# Altium footprint library ICL_komponenty_v1.PcbLib: 160 footprints (part 2 of 10)
Each footprint in its own frame and in the unit in brackets; x right, y up, seen from the top. Pads: shape width x height; smd on the part's side, far side on the other; paste and mask are expansions set on the pad; w line width, h text height; cw(c..) or ccw(c..) is an arc to the next point about the centre after c.
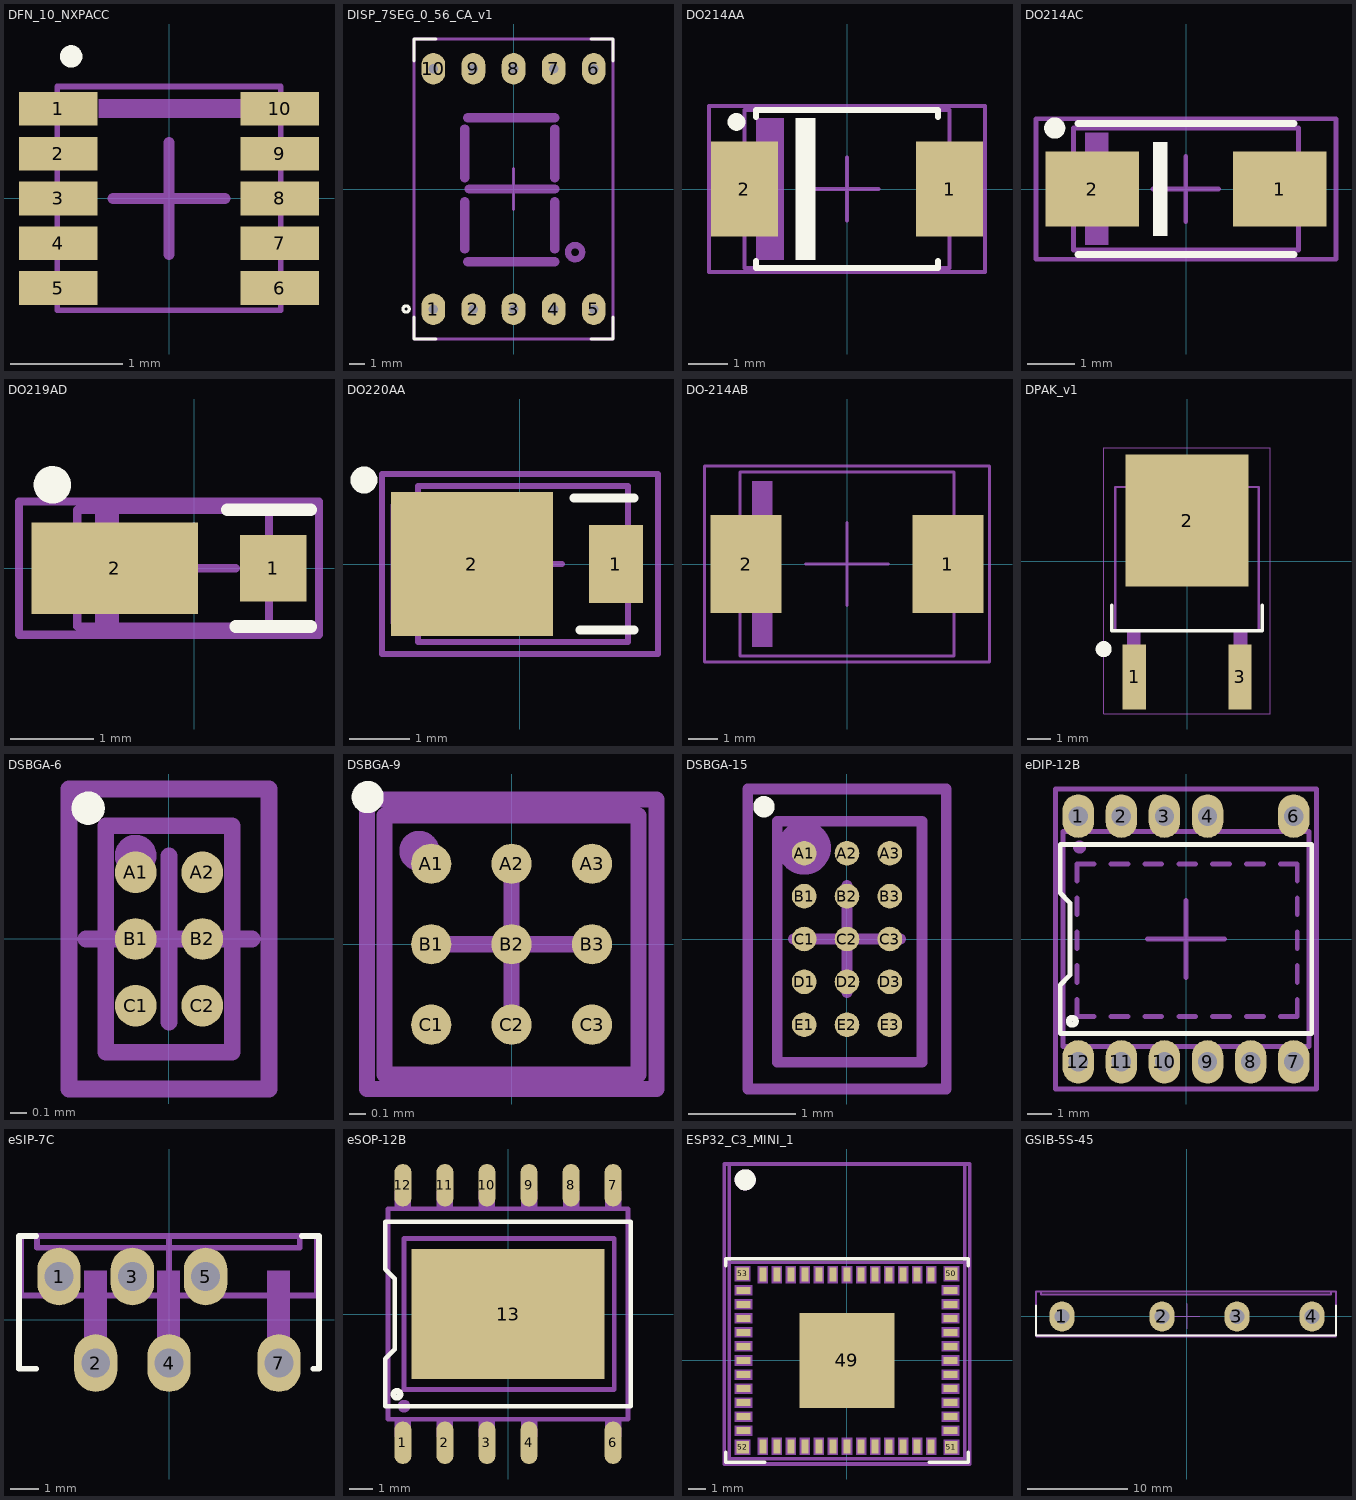
[diagram p1: the footprints below, top view; thin cyan lines are the x and y axes]

## DFN_10_NXPACC [mm] "FXLS8964"
height 1
pads (10):
  rect 0.7x0.3 smd: 1(-0.99,0.8) 2(-0.99,0.4) 3(-0.99,0) 4(-0.99,-0.4) 5(-0.99,-0.8) 6(0.99,-0.8) 7(0.99,-0.4) 8(0.99,0) 9(0.99,0.4) 10(0.99,0.8)
Top Overlay:
  circle w0.1: c-0.874,1.269 r0.05
Top M11-12_SMOT:
  rectangle: -0.628,0.719 0.653,0.887
  region: 1.041,0.131 0.831,0.131 0.831,-0.122 1.041,-0.122
  rectangle: -1.041,-0.131 -0.831,0.122
  region: 1.041,0.931 0.831,0.931 0.831,0.678 1.041,0.678
  region: 1.041,0.531 0.831,0.531 0.831,0.278 1.041,0.278
  region: 1.041,-0.269 0.831,-0.269 0.831,-0.522 1.041,-0.522
  region: 1.041,-0.669 0.831,-0.669 0.831,-0.922 1.041,-0.922
  rectangle: -1.041,0.269 -0.831,0.522
  rectangle: -1.041,0.669 -0.831,0.922
  rectangle: -1.041,-0.931 -0.831,-0.678
  rectangle: -1.041,-0.531 -0.831,-0.278
  lines w0.05: -1,-0.999 1,-0.999 1,1 -1,1 -1,-0.999
Top M13-14_SDES:
  text "'.Designator'" at 0.25,-3.399 h0.6
Top M15-16_SORG:
  lines w0.1: -0.5,0 0.5,0 ; 0,-0.5 0,0.5
3D body "DFN_10_NXPACC.step": height 1, standoff 0, extent -1.001,-1 1.001,1

## DISP_7SEG_0_56_CA_v1 [mm]
pads (10):
  oval 1.5x2 hole 0.6: 1(-5.08,-7.62) 2(-2.54,-7.62) 3(0,-7.62) 4(2.54,-7.62) 5(5.08,-7.62) 6(5.08,7.62) 7(2.54,7.62) 8(0,7.62) 9(-2.54,7.62) 10(-5.08,7.62)
Top Overlay:
  circle w0.2: c-6.8,-7.6 r0.2
  lines w0.2: -6.3,-8.1 -6.3,-9.5 -4.9,-9.5 ; -6.3,8.1 -6.3,9.5 -4.9,9.5 ; 4.9,-9.5 6.3,-9.5 6.3,-8.1 ; 4.9,9.5 6.3,9.5 6.3,8.1
Top M17-18_TDES:
  text "'.Designator'" at -4.865,3.283 h1
Top M19-20_TMOT:
  circle w0.4: c3.9,-4 r0.447
  lines w0.2: -6.3,-9.5 -6.3,9.5 6.3,9.5 6.3,-9.5 -6.3,-9.5
  lines w0.6: -3.1,-3.8 -3.1,-0.8 ; -3.1,0.7 -3.1,3.8 ; -2.9,-4.6 2.6,-4.6 ; -2.9,4.5 2.6,4.5 ; -2.8,0 2.6,0 ; 2.6,-3.8 2.6,-0.8 ; 2.6,0.7 2.6,3.8
Top M25-26_TORG:
  lines w0.2: -1.3,0 0,0 ; 0,-1.3 0,0 ; 0,1.3 0,0 ; 1.3,0 0,0
3D body "7seg_0_56_v1w.stp": height 8.01, standoff -2.09, extent -6.3,-9.5 6.3,9.5

## DO214AA [mm]
pads (2):
  rect 1.7x2.4 smd: 1(2.6,0) 2(-2.6,0)
Top Overlay:
  circle w0.25: c-2.8,1.7 r0.1
  rectangle: -1.3,-1.8 -0.8,1.8
  lines w0.152: -2.3,-1.82 -2.3,-2 2.3,-2 2.3,-1.82 ; -2.3,1.82 -2.3,2 2.3,2 2.3,1.82
Top M11-12_SMOT:
  rectangle: -3.1,-1.1 -2.6,1.064
  region: 3.1,1.1 2.6,1.1 2.6,-1.064 3.1,-1.064
  rectangle: -2.3,-1.8 -1.6,1.8
  lines w0.1: -2.6,-2 -2.6,2 2.6,2 2.6,-2 -2.6,-2
Top M13-14_SDES:
  text "'.Designator'" at -5.665,-0.417 h1
Top M15-16_SORG:
  lines w0.1: -0.8,0 0,0 ; 0,-0.8 0,0 ; 0,0.8 0,0 ; 0.8,0 0,0 ; -3.5,-2.1 -3.5,2.1 3.5,2.1 3.5,-2.1 -3.5,-2.1
3D body "DO214AA.step": height 2.45, standoff 0.03, extent -2.754,-1.95 2.746,1.95

## DO214AC [mm]
pads (2):
  rect 2x1.6 smd: 1(2,0) 2(-2,0)
Top Overlay:
  circle w0.25: c-2.8,1.3 r0.1
  rectangle: -0.7,-1 -0.4,1
  lines w0.152: -2.3,-1.4 2.3,-1.4 ; -2.3,1.4 2.3,1.4
Top M11-12_SMOT:
  rectangle: -2.9,-0.7 -2.4,0.7
  region: 2.9,0.69 2.4,0.69 2.4,-0.697 2.9,-0.697
  rectangle: -2.157,-1.193 -1.657,1.207
  lines w0.1: -2.4,-1.3 -2.4,1.3 2.4,1.3 2.4,-1.3 -2.4,-1.3
Top M13-14_SDES:
  text "'.Designator'" at -4.232,-0.333 h0.8
Top M15-16_SORG:
  lines w0.1: -0.704,-0.001 -0.004,-0.001 ; -0.004,-0.702 -0.004,-0.001 ; -0.004,0.7 -0.004,-0.001 ; 0.697,-0.001 -0.004,-0.001 ; -3.2,-1.5 3.2,-1.5 3.2,1.5 -3.2,1.5 -3.2,-1.5
3D body "DO-214AC.step": height 2.45, standoff 0.05, extent -2.604,-1.301 2.596,1.299

## DO219AD [mm]
pads (2):
  rect 0.8x0.8 smd: 1(0.95,0)
  rect 2x1.1 smd: 2(-0.95,0)
Top Overlay:
  circle w0.25: c-1.7,1 r0.1
  lines w0.152: 0.4,0.7 1.4,0.7 ; 0.5,-0.7 1.4,-0.7
Top M11-12_SMOT:
  rectangle: -1.188,-0.7 -0.9,0.7
  region: 1.1,0.3 0.6,0.3 0.6,-0.3 1.1,-0.3
  rectangle: -1.7,-0.4 -0.1,0.4
  lines w0.1: -1.4,-0.7 -1.4,0.7 0.9,0.7 0.9,-0.7 -1.4,-0.7
Top M13-14_SDES:
  text "'.Designator'" at -3.682,1.429 h0.65
Top M15-16_SORG:
  lines w0.1: -0.5,-0.001 -0.004,-0.001 ; -0.004,-0.5 -0.004,-0.001 ; -0.004,0.5 -0.004,-0.001 ; 0.5,-0.001 -0.004,-0.001 ; -2.1,-0.8 1.5,-0.8 1.5,0.8 -2.1,0.8 -2.1,-0.8
3D body "MSMP package.STEP": height 0.69, standoff 0.01, extent -1.52,-0.658 0.98,0.642

## DO220AA [mm]
pads (2):
  rect 0.9x1.3 smd: 1(1.6,0)
  rect 2.7x2.4 smd: 2(-0.8,0)
Top Overlay:
  circle w0.25: c-2.6,1.4 r0.1
  lines w0.152: 0.9,1.1 1.9,1.1 ; 1,-1.1 1.9,-1.1
Top M11-12_SMOT:
  region: 2.05,0.5 1.8,0.5 1.8,-0.5 2.05,-0.5
  rectangle: -2.157,-1 -0.1,1
  lines w0.1: -1.7,-1.3 -1.7,1.3 1.8,1.3 1.8,-1.3 -1.7,-1.3
Top M13-14_SDES:
  text "'.Designator'" at -3.682,2.029 h0.65
Top M15-16_SORG:
  lines w0.1: -0.704,-0.001 -0.004,-0.001 ; -0.004,-0.702 -0.004,-0.001 ; -0.004,0.7 -0.004,-0.001 ; 0.697,-0.001 -0.004,-0.001 ; -2.3,-1.5 2.3,-1.5 2.3,1.5 -2.3,1.5 -2.3,-1.5
3D body "DO220AA.stp": height 1.01, standoff 0.01, extent -1.92,-1.015 1.93,1.015

## DO-214AB [mm] "DO-214AB TSV"
pads (2):
  rect 2.4x3.3 smd: 1(3.4,0) 2(-3.4,0)
Top M11-12_SMOT:
  rectangle: -3.2,-2.8 -2.5,2.8
  region: 3.9,1.6 3.6,1.6 3.6,-1.6 3.9,-1.6
  rectangle: -3.9,-1.6 -3.6,1.6
  lines w0.1: -3.6,-3.1 -3.6,3.1 3.6,3.1 3.6,-3.1 -3.6,-3.1
Top M13-14_SDES:
  text "'.Designator'" at 0.25,-3.399 h0.6
Top M15-16_SORG:
  lines w0.1: -1.4,0 0,0 ; 0,-1.4 0,0 ; 0,1.4 0,0 ; 1.4,0 0,0 ; -4.8,-3.3 -4.8,3.3 4.8,3.3 4.8,-3.3 -4.8,-3.3
3D body "DO214AB_K.step": height 2.6, standoff -0.02, extent -4.106,-3.11 4.174,3.11

## DPAK_v1 [mm] "D-PAK, 3-Pads, Body 6,20x6,72mm (max), IPC Low Density"
height 2.39
pads (3):
  rect 1x2.8 smd: 1(-2.28,-5) 3(2.28,-5)
  rect 5.3x5.7 smd: 2(0,1.75)
Top Overlay:
  circle w0.35: c-3.6,-3.8 r0.172
  lines w0.152: -3.25,-1.9 -3.25,-3 3.25,-3 3.25,-1.9
Top M11-12_SMOT:
  rectangle: -2.6,-5.8 -2,-3
  rectangle: 2,-5.8 2.6,-3
  region: 2.6,3.2 2.6,4.3 -2.6,4.3 -2.6,3.2
  lines w0.1: -3.1,-3 -3.1,3.2 3.1,3.2 3.1,-3 -3.1,-3
Top M13-14_SDES:
  text "'.Designator'" at -5.665,-2.417 h1
Top M15-16_SORG:
  lines w0.05: -3.6,-6.6 3.6,-6.6 3.6,4.9 -3.6,4.9 -3.6,-6.6
  lines w0.1: -0.5,0 0.5,0 ; 0,-0.5 0,0.5
3D body "DPAK-1.step": height 2.3, standoff -0.12, extent -3.27,-5.811 3.27,4.127

## DSBGA-6 [mm]
height 0.63
pads (6):
  round 0.25 smd mask+0.05: A1(-0.2,0.4) A2(0.2,0.4) B1(-0.2,0) B2(0.2,0) C1(-0.2,-0.4) C2(0.2,-0.4)
Top Overlay:
  circle w0.1: c-0.485,0.785 r0.05
Top Solder:
  lines w0.2: -0.2,-0.4 -0.2,0.4 0.2,0.4 0.2,-0.4 -0.2,-0.4
  lines w0.3: 0,-0.3 0,0.3
Top M11-12_SMOT:
  circle w0.15: c-0.2,0.5 r0.05
  lines w0.1: -0.38,-0.68 -0.38,0.68 0.38,0.68 0.38,-0.68 -0.38,-0.68
Top M13-14_SDES:
  text "'.Designator'" at -3.399,-0.25 h0.6
Top M15-16_SORG:
  lines w0.1: -0.5,0 0.5,0 ; 0,-0.5 0,0.5 ; -0.6,-0.9 -0.6,0.9 0.6,0.9 0.6,-0.9 -0.6,-0.9
3D body "DSBGA-6.step": height 0.62, standoff 0, extent -0.38,-0.68 0.38,0.68

## DSBGA-9 [mm] "0,5x0,5 mm BGA TI"
height 0.63
pads (9):
  round 0.25 smd mask+0.05: A1(-0.5,0.5) A2(0,0.5) A3(0.5,0.5) B1(-0.5,0) B2(0,0) B3(0.5,0) C1(-0.5,-0.5) C2(0,-0.5) C3(0.5,-0.5)
Top Overlay:
  circle w0.1: c-0.895,0.915 r0.05
Top M11-12_SMOT:
  circle w0.15: c-0.574,0.58 r0.05
  lines w0.1: -0.79,-0.81 -0.79,0.8 0.79,0.8 0.79,-0.81 -0.79,-0.81
Top M13-14_SDES:
  text "'.Designator'" at -3.399,-0.25 h0.6
Top M15-16_SORG:
  lines w0.1: -0.5,0 0.5,0 ; 0,-0.5 0,0.5 ; -0.9,-0.9 -0.9,0.9 0.9,0.9 0.9,-0.9 -0.9,-0.9
3D body "DSBGA-9.step": height 0.63, standoff 0, extent -0.79,-0.81 0.79,0.81

## DSBGA-15 [mm] "BGA, 15-Leads, Body 1,34x2,26mmx0,63mm, Pitch 0,40mm"
height 0.63
pads (15):
  round 0.23 smd mask+0.05: A1(-0.4,0.8) A2(0,0.8) A3(0.4,0.8) B1(-0.4,0.4) B2(0,0.4) B3(0.4,0.4) C1(-0.4,0) C2(0,0) C3(0.4,0) D1(-0.4,-0.4) D2(0,-0.4) D3(0.4,-0.4) E1(-0.4,-0.8) E2(0,-0.8) E3(0.4,-0.8)
Top Overlay:
  circle w0.1: c-0.775,1.235 r0.05
Top M11-12_SMOT:
  circle w0.4: c-0.4,0.85 r0.05
  lines w0.1: -0.65,-1.15 0.7,-1.15 0.7,1.1 -0.65,1.1 -0.65,-1.15
Top M13-14_SDES:
  text "'.Designator'" at -3.399,-0.25 h0.6
Top M15-16_SORG:
  lines w0.1: -0.5,0 0.5,0 ; 0,-0.5 0,0.5 ; -0.925,-1.4 0.925,-1.4 0.925,1.4 -0.925,1.4 -0.925,-1.4
3D body "DSBGA-15.step": height 0.63, standoff 0, extent -0.67,-1.13 0.67,1.13

## eDIP-12B [mm]
pads (11):
  oval 1.3x1.8 hole 0.8: 1(-4.45,5.08) 2(-2.67,5.08) 3(-0.89,5.08) 4(0.89,5.08) 6(4.45,5.08) 7(4.45,-5.08) 8(2.67,-5.08) 9(0.89,-5.08) 10(-0.89,-5.08) 11(-2.67,-5.08) 12(-4.45,-5.08)
Top Overlay:
  circle w0.254: c-4.7,-3.4 r0.141
  lines w0.2: -5.2,-3.9 5.2,-3.9 5.2,1.1 5.2,3.9 -5.2,3.9 -5.2,1.9 -4.8,1.5 -4.8,-1.5 -5.2,-1.9 -5.2,-3.9
Top M17-18_TDES:
  text "'.Designator'" at -4.432,1.967 h0.8
Top M19-20_TMOT:
  circle w0.254: c-4.4,3.8 r0.141
  region: -4.1,5.2 -4.8,5.2 -4.8,4.4 -4.1,4.4
  region: -2.32,5.2 -3.02,5.2 -3.02,4.4 -2.32,4.4
  region: -0.54,5.2 -1.24,5.2 -1.24,4.4 -0.54,4.4
  region: 1.24,5.2 0.54,5.2 0.54,4.4 1.24,4.4
  region: 4.8,5.2 4.1,5.2 4.1,4.4 4.8,4.4
  rectangle: 4.1,-5.2 4.8,-4.4
  rectangle: 0.54,-5.2 1.24,-4.4
  rectangle: -1.24,-5.2 -0.54,-4.4
  rectangle: -3.02,-5.2 -2.32,-4.4
  rectangle: -4.8,-5.2 -4.1,-4.4
  region: 3,-4.4 2.3,-4.4 2.3,-5.2 3,-5.2
  lines w0.2: -4.5,-2.5 -4.5,-3.2 -3.8,-3.2 ; -4.5,-1.8 -4.5,-1.1 ; -4.5,-0.4 -4.5,0.3 ; -4.5,1 -4.5,1.7 ; -4.5,2.4 -4.5,3.1 -3.8,3.1 ; -3.1,-3.2 -2.4,-3.2 ; -3.1,3.1 -2.4,3.1 ; -1.7,-3.2 -1,-3.2 ; -1.7,3.1 -1,3.1 ; -0.3,-3.2 0.4,-3.2 ; -0.3,3.1 0.4,3.1 ; 1.1,-3.2 1.8,-3.2 ; 1.1,3.1 1.8,3.1 ; 2.5,-3.2 3.2,-3.2 ; 2.5,3.1 3.2,3.1 ; 3.9,-3.2 4.6,-3.2 4.6,-2.5 ; 3.9,3.1 4.6,3.1 4.6,2.4 ; 4.6,-1.8 4.6,-1.1 ; 4.6,-0.4 4.6,0.3 ; 4.6,1 4.6,1.7 ; -5.08,-4.45 5.08,-4.45 5.08,4.45 -5.08,4.45 -5.08,-4.45
Top M25-26_TORG:
  lines w0.2: -1.6,0 0,0 ; 0,-1.6 0,0 ; 0,1.6 0,0 ; 1.6,0 0,0 ; -5.4,-6.2 -5.4,6.2 5.4,6.2 5.4,-6.2 -5.4,-6.2
3D body "eDIP-12B_PWI.step": height 2.1, standoff -2.98, extent -5.06,-5.486 5.1,5.486

## eSIP-7C [mm]
pads (6):
  oval 1.5x2 hole 1: 1(-3.81,1.5) 2(-2.54,-1.5) 3(-1.27,1.5) 4(0,-1.5) 5(1.27,1.5) 7(3.81,-1.5)
Top Overlay:
  lines w0.2: -4.6,-1.7 -5.2,-1.7 -5.2,2.9 -4.6,2.9 ; 4.6,2.9 5.2,2.9 5.2,-1.7 5,-1.7
Top M15-16_SORG:
  lines w0.2: -1.6,2.9 0,2.9 ; 0,0 0,2.9 ; 1.6,2.9 0,2.9
Top M17-18_TDES:
  text "'.Designator'" at -4.432,3.567 h0.8
Top M19-20_TMOT:
  region: -3.42,1.7 -4.22,1.7 -4.22,1.3 -3.42,1.3
  region: -2.15,1.7 -2.95,1.7 -2.95,-1.7 -2.15,-1.7
  region: 4.2,1.7 3.4,1.7 3.4,-1.7 4.2,-1.7
  region: 0.39,1.7 -0.41,1.7 -0.41,-1.7 0.39,-1.7
  region: -0.88,1.7 -1.68,1.7 -1.68,1.3 -0.88,1.3
  region: 1.66,1.7 0.86,1.7 0.86,1.3 1.66,1.3
  lines w0.2: -4.571,2.9 -4.571,2.5 4.529,2.5 4.529,2.9 ; -5.12,0.84 -5.12,2.9 5.12,2.9 5.12,0.84 -5.12,0.84
3D body "eSIP-7C.STEP": height 12.25, standoff -1.25, extent -5.12,-1.705 5.12,2.885

## eSOP-12B [mm]
pads (12):
  oval 0.72x1.8 smd: 1(-4.45,-5.45) 2(-2.67,-5.45) 3(-0.89,-5.45) 4(0.89,-5.45) 6(4.45,-5.45) 7(4.45,5.45) 8(2.67,5.45) 9(0.89,5.45) 10(-0.89,5.45) 11(-2.67,5.45) 12(-4.45,5.45)
  rect 8.15x5.51 smd: 13(0,0)
Top Overlay:
  circle w0.254: c-4.7,-3.4 r0.141
  lines w0.2: -5.2,-3.9 5.2,-3.9 5.2,1.1 5.2,3.9 -5.2,3.9 -5.2,1.9 -4.8,1.5 -4.8,-1.5 -5.2,-1.9 -5.2,-3.9
Top M11-12_SMOT:
  circle w0.254: c-4.4,-3.9 r0.141
  rectangle: 4.1,-5.2 4.8,-4.4
  rectangle: 0.54,-5.2 1.24,-4.4
  rectangle: -1.24,-5.2 -0.54,-4.4
  rectangle: -3.02,-5.2 -2.32,-4.4
  rectangle: -4.8,-5.2 -4.1,-4.4
  region: -4.1,5.2 -4.8,5.2 -4.8,4.4 -4.1,4.4
  region: -2.32,5.2 -3.02,5.2 -3.02,4.4 -2.32,4.4
  region: -0.54,5.2 -1.24,5.2 -1.24,4.4 -0.54,4.4
  region: 1.24,5.2 0.54,5.2 0.54,4.4 1.24,4.4
  region: 4.8,5.2 4.1,5.2 4.1,4.4 4.8,4.4
  region: 3.02,5.2 2.32,5.2 2.32,4.4 3.02,4.4
  lines w0.2: -5.08,-4.45 5.08,-4.45 5.08,4.45 -5.08,4.45 -5.08,-4.45 ; -4.4,-3.2 4.5,-3.2 4.5,-1.6 4.5,3.2 -4.4,3.2 -4.4,-3.2
Top M13-14_SDES:
  text "'.Designator'" at -6.598,-0.4 h1.2
Top M15-16_SORG:
  lines w0.2: -1.6,0 0,0 ; 0,-1.6 0,0 ; 0,1.6 0,0 ; 1.6,0 0,0
3D body "eSOP-12B-1.step": height 2.49, standoff 0.01, extent -5.08,-6.116 5.08,5.974

## ESP32_C3_MINI_1 [mm]
pads (53):
  rect 0.8x0.4 smd: 1(-5.9,4) 2(-5.9,3.2) 3(-5.9,2.4) 4(-5.9,1.6) 5(-5.9,0.8) 6(-5.9,0) 7(-5.9,-0.8) 8(-5.9,-1.6) 9(-5.9,-2.4) 10(-5.9,-3.2) 11(-5.9,-4) 25(5.9,-4) 26(5.9,-3.2) 27(5.9,-2.4) 28(5.9,-1.6) 29(5.9,-0.8) 30(5.9,0) 31(5.9,0.8) 32(5.9,1.6) 33(5.9,2.4) 34(5.9,3.2) 35(5.9,4)
  rect 0.4x0.8 smd: 12(-4.8,-4.9) 13(-4,-4.9) 14(-3.2,-4.9) 15(-2.4,-4.9) 16(-1.6,-4.9) 17(-0.8,-4.9) 18(0,-4.9) 19(0.8,-4.9) 20(1.6,-4.9) 21(2.4,-4.9) 22(3.2,-4.9) 23(4,-4.9) 24(4.8,-4.9) 36(4.8,4.9) 37(4,4.9) 38(3.2,4.9) 39(2.4,4.9) 40(1.6,4.9) 41(0.8,4.9) 42(0,4.9) 43(-0.8,4.9) 44(-1.6,4.9) 45(-2.4,4.9) 46(-3.2,4.9) 47(-4,4.9) 48(-4.8,4.9)
  rect 5.4x5.4 smd paste-2.7: 49(0,0)
  rect 0.7x0.7 smd: 50(5.95,4.95) 51(5.95,-4.95) 52(-5.95,-4.95) 53(-5.95,4.95)
Top Layer:
  pour cut-out: -2.675,-0.415 -2.675,0.09 -2.17,0.09 -2.17,0.595 -1.665,0.595 -1.665,0.09 -1.16,0.09 -1.16,-0.415 -1.665,-0.415 -1.665,-0.92 -2.17,-0.92 -2.17,-0.415
  pour cut-out: -0.84,-0.415 -0.84,0.09 -0.335,0.09 -0.335,0.595 0.17,0.595 0.17,0.09 0.675,0.09 0.675,-0.415 0.17,-0.415 0.17,-0.92 -0.335,-0.92 -0.335,-0.415
  pour cut-out: -0.84,1.42 -0.335,1.42 -0.335,0.915 0.17,0.915 0.17,1.42 0.675,1.42 0.675,1.925 0.17,1.925 0.17,2.43 -0.335,2.43 -0.335,1.925 -0.84,1.925
  pour cut-out: -2.17,0.915 -2.17,1.42 -2.675,1.42 -2.675,1.925 -2.17,1.925 -2.17,2.43 -1.665,2.43 -1.665,1.925 -1.16,1.925 -1.16,1.42 -1.665,1.42 -1.665,0.915
Top Overlay:
  circle w0.6: c-5.8,10.3 r0.3
  lines w0.2: -6.9,-5.244 -6.9,-5.8 -4.7,-5.8 ; -6.9,5.4 -6.9,5.8 6.9,5.8 6.9,5.4 ; 4.697,-5.8 6.9,-5.8 6.9,-5.244
Top Paste:
  rectangle: 1.25,1.25 2.7,2.7
  rectangle: -0.725,1.25 0.725,2.7
  rectangle: -2.7,1.25 -1.25,2.7
  rectangle: 1.25,-0.725 2.7,0.725
  rectangle: 1.25,-2.7 2.7,-1.25
  rectangle: -0.725,-0.725 0.725,0.725
  rectangle: -0.725,-2.7 0.725,-1.25
  rectangle: -2.7,-0.725 -1.25,0.725
  rectangle: -2.7,-2.7 -1.25,-1.25
Top M11-12_SMOT:
  circle w0.6: c-5.8,10.3 r0.3
  rectangle: -6.4,4.5 -5.5,5.4
  rectangle: -6.4,2.9 -5.4,3.5
  rectangle: -6.4,3.7 -5.4,4.3
  region: 2.5,2.5 1.466,2.5 1.466,1.5 2.5,1.5
  region: 2.5,0.5 1.466,0.5 1.466,-0.5 2.5,-0.5
  region: 2.534,-1.5 1.5,-1.5 1.5,-2.5 2.534,-2.5
  region: 0.534,2.5 -0.5,2.5 -0.5,1.5 0.534,1.5
  region: 0.5,0.5 -0.534,0.5 -0.534,-0.5 0.5,-0.5
  region: 0.534,-1.5 -0.5,-1.5 -0.5,-2.5 0.534,-2.5
  region: -1.466,2.5 -2.5,2.5 -2.5,1.5 -1.466,1.5
  region: -1.466,0.5 -2.5,0.5 -2.5,-0.5 -1.466,-0.5
  region: -1.466,-1.5 -2.5,-1.5 -2.5,-2.5 -1.466,-2.5
  rectangle: -6.4,2.1 -5.4,2.7
  rectangle: -6.4,1.3 -5.4,1.9
  rectangle: -6.4,0.5 -5.4,1.1
  rectangle: -6.4,-0.3 -5.4,0.3
  rectangle: -6.4,-1.1 -5.4,-0.5
  rectangle: -6.4,-1.9 -5.4,-1.3
  rectangle: -6.4,-2.7 -5.4,-2.1
  rectangle: -6.4,-3.5 -5.4,-2.9
  rectangle: -6.4,-4.3 -5.4,-3.7
  rectangle: -6.4,-5.4 -5.5,-4.5
  region: 6.4,-4.5 5.5,-4.5 5.5,-5.4 6.4,-5.4
  region: 6.4,-2.9 5.4,-2.9 5.4,-3.5 6.4,-3.5
  region: 6.4,-3.7 5.4,-3.7 5.4,-4.3 6.4,-4.3
  region: 6.4,-2.1 5.4,-2.1 5.4,-2.7 6.4,-2.7
  region: 6.4,-1.3 5.4,-1.3 5.4,-1.9 6.4,-1.9
  region: 6.4,-0.5 5.4,-0.5 5.4,-1.1 6.4,-1.1
  region: 6.4,0.3 5.4,0.3 5.4,-0.3 6.4,-0.3
  region: 6.4,1.1 5.4,1.1 5.4,0.5 6.4,0.5
  region: 6.4,1.9 5.4,1.9 5.4,1.3 6.4,1.3
  region: 6.4,2.7 5.4,2.7 5.4,2.1 6.4,2.1
  region: 6.4,3.5 5.4,3.5 5.4,2.9 6.4,2.9
  region: 6.4,4.3 5.4,4.3 5.4,3.7 6.4,3.7
  region: 6.4,5.4 5.5,5.4 5.5,4.5 6.4,4.5
  region: 2.9,5.4 2.9,4.4 3.5,4.4 3.5,5.4
  region: 3.7,5.4 3.7,4.4 4.3,4.4 4.3,5.4
  region: 2.1,5.4 2.1,4.4 2.7,4.4 2.7,5.4
  region: 1.3,5.4 1.3,4.4 1.9,4.4 1.9,5.4
  region: 0.5,5.4 0.5,4.4 1.1,4.4 1.1,5.4
  region: -0.3,5.4 -0.3,4.4 0.3,4.4 0.3,5.4
  region: -1.1,5.4 -1.1,4.4 -0.5,4.4 -0.5,5.4
  region: -1.9,5.4 -1.9,4.4 -1.3,4.4 -1.3,5.4
  region: -2.7,5.4 -2.7,4.4 -2.1,4.4 -2.1,5.4
  region: -3.5,5.4 -3.5,4.4 -2.9,4.4 -2.9,5.4
  region: -4.3,5.4 -4.3,4.4 -3.7,4.4 -3.7,5.4
  region: 4.5,5.4 4.5,4.4 5.1,4.4 5.1,5.4
  region: -5.1,5.4 -5.1,4.4 -4.5,4.4 -4.5,5.4
  region: -2.9,-5.4 -2.9,-4.4 -3.5,-4.4 -3.5,-5.4
  region: -3.7,-5.4 -3.7,-4.4 -4.3,-4.4 -4.3,-5.4
  region: -2.1,-5.4 -2.1,-4.4 -2.7,-4.4 -2.7,-5.4
  region: -1.3,-5.4 -1.3,-4.4 -1.9,-4.4 -1.9,-5.4
  region: -0.5,-5.4 -0.5,-4.4 -1.1,-4.4 -1.1,-5.4
  region: 0.3,-5.4 0.3,-4.4 -0.3,-4.4 -0.3,-5.4
  region: 1.1,-5.4 1.1,-4.4 0.5,-4.4 0.5,-5.4
  region: 1.9,-5.4 1.9,-4.4 1.3,-4.4 1.3,-5.4
  region: 2.7,-5.4 2.7,-4.4 2.1,-4.4 2.1,-5.4
  region: 3.5,-5.4 3.5,-4.4 2.9,-4.4 2.9,-5.4
  region: 4.3,-5.4 4.3,-4.4 3.7,-4.4 3.7,-5.4
  region: -4.5,-5.4 -4.5,-4.4 -5.1,-4.4 -5.1,-5.4
  region: 5.1,-5.4 5.1,-4.4 4.5,-4.4 4.5,-5.4
  lines w0.2: -6.7,-5.6 6.7,-5.6 6.7,11.2 -6.7,11.2 -6.7,-5.6
Top M13-14_SDES:
  text "'.Designator'" at -5.765,7.283 h1
Top M15-16_SORG:
  lines w0.2: -7,5.585 7,5.6 ; -7,-5.9 -7,11.2 7,11.2 7,-5.9 -7,-5.9
3D body "ESP32-C3-MINI-1-N4--3DModel-STEP-1.STEP": height 2.56, standoff 0.01, extent -6.6,-5.6 6.6,11

## GSIB-5S-45 [mm] "dridge rectifier 45 degry"
pads (4):
  oval 2.5x3 hole 1.5: 1(-12.5,0) 2(-2.5,0) 3(5,0) 4(12.5,0)
Top Overlay:
  lines w0.2: -15.1,1.1 -15.1,-1.9 14.9,-1.9 14.9,1.1
Top M15-16_SORG:
  lines w0.1: -1.2,0 1.3,0 ; 0,-1.202 0,1.298 ; -15.1,-2 -15.1,2.5 14.9,2.5 14.9,-2 -15.1,-2
Top M17-18_TDES:
  text "'.Designator'" at -5.665,-4.517 h1
Top M19-20_TMOT:
  lines w0.2: -14.6,2.5 -14.6,2.2 14.4,2.2 14.4,2.5 ; -15.1,-1.9 -15.1,2.5 14.9,2.5 14.9,-1.9 -15.1,-1.9
3D body "786900swa001_bridge.stp": height 19.25, standoff -2.5, extent -15,-0.25 15,23.74